# Altium footprint library THD Connectors-1.PcbLib: 129 footprints (part 2 of 9)
Each footprint in its own frame and in the unit in brackets; x right, y up, seen from the top. Pads: shape width x height; smd on the part's side, far side on the other; paste and mask are expansions set on the pad; w line width, h text height; cw(c..) or ccw(c..) is an arc to the next point about the centre after c.
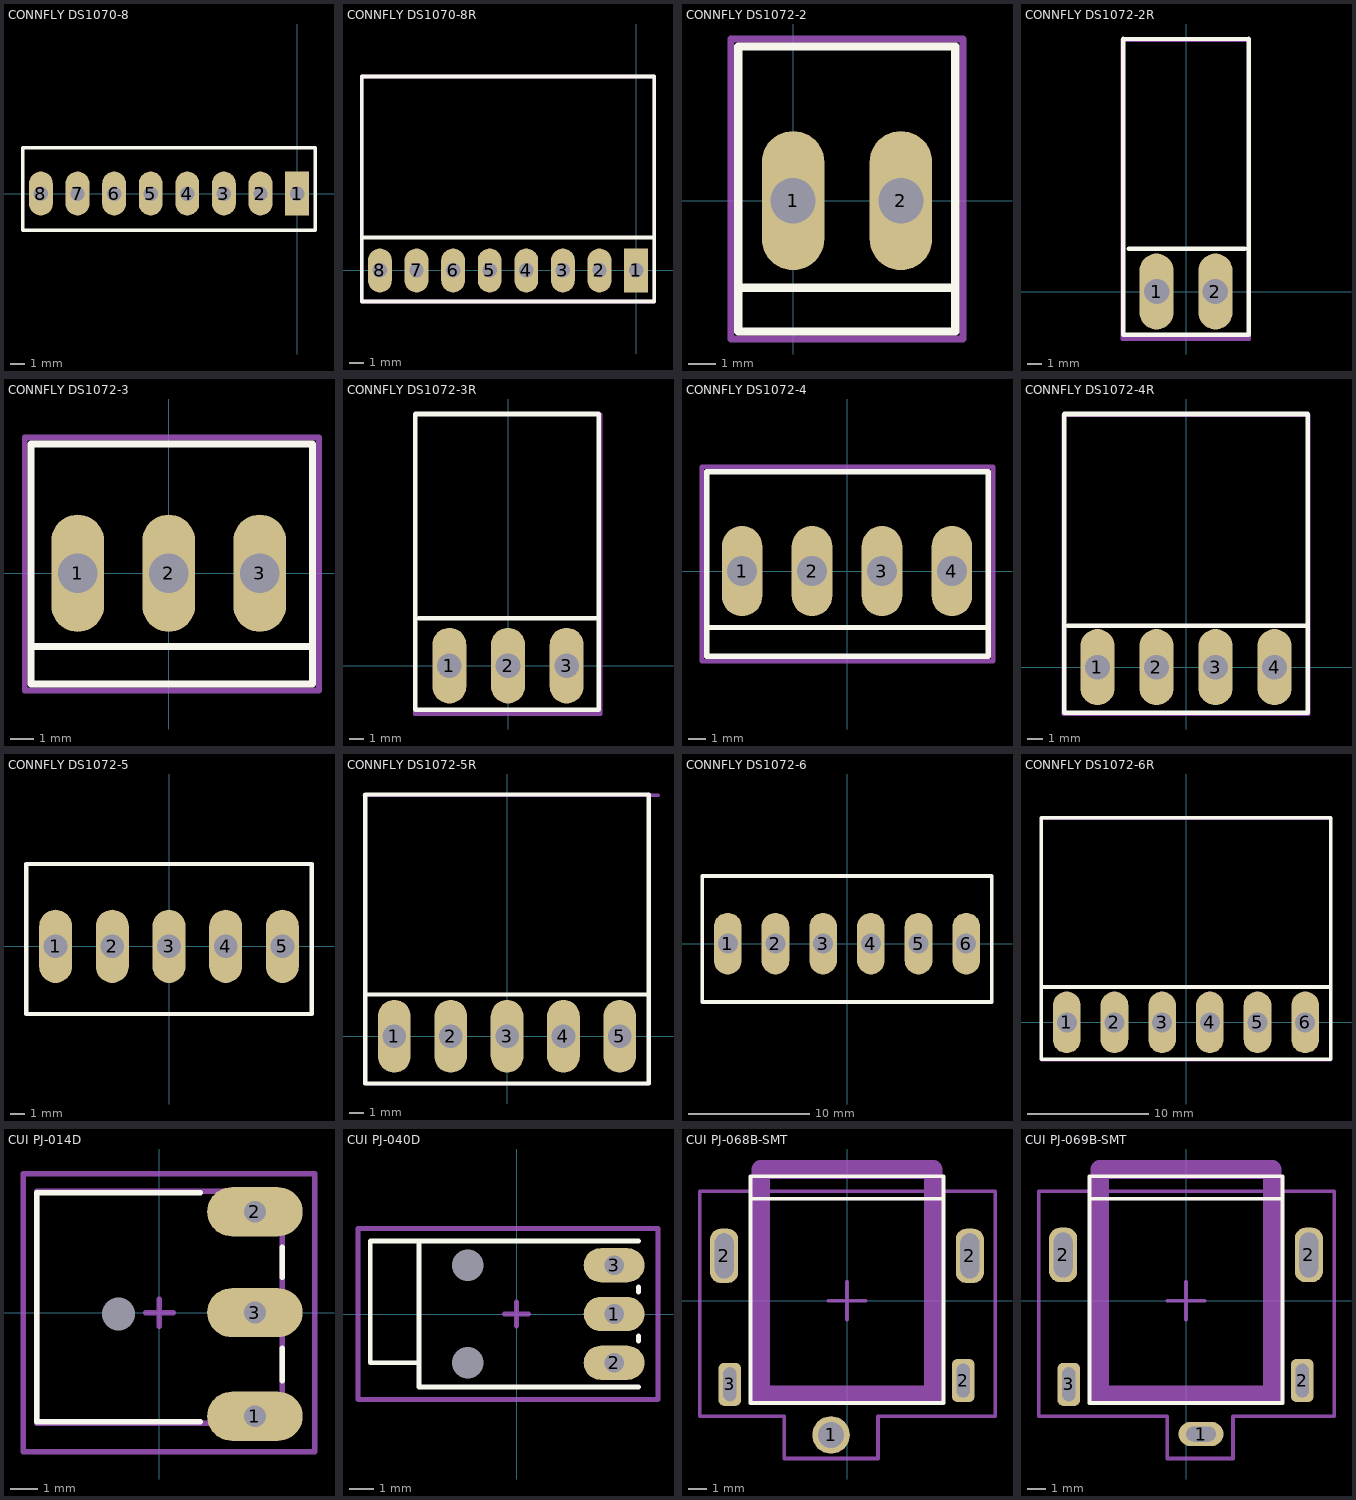
[diagram p1: the footprints below, top view; thin cyan lines are the x and y axes]

## CONNFLY DS1070-8 [mil]
pads (8):
  rect 65x120 hole 39.37: 1(0,0)
  oval 65x120 hole 39.37: 2(-100,0) 3(-200,0) 4(-300,0) 5(-400,0) 6(-500,0) 7(-600,0) 8(-700,0)
Top Overlay:
  lines w10: -750,-100 50,-100 50,125 -750,125 -750,-100
3D body "WF-8.STEP": height 448.15, standoff -134.53, extent -750,-98.35 50,130

## CONNFLY DS1070-8R [mil]
pads (8):
  rect 65x120 hole 39.37: 1(0,0)
  oval 65x120 hole 39.37: 2(-100,0) 3(-200,0) 4(-300,0) 5(-400,0) 6(-500,0) 7(-600,0) 8(-700,0)
Top Overlay:
  lines w10: -750,90 50,90 ; -750,-85 -750,530 50,530 50,-85 -750,-85
Mechanical 15:
  lines w10: -750,-85 -750,530 50,530 50,-85 -750,-85
3D body "WF-8R (BM).STEP": height 228.35, standoff -137.8, extent -750,-15 50,525.16

## CONNFLY DS1072-2 [mil] "connfly electronic CO,.LTD."
pads (2):
  oval 90x200 hole 65: 1(0,0) 2(155,0)
Top Overlay:
  lines w11.81: -78.74,221.46 233.27,221.46
  lines w12: -78.74,221.46 -78.74,-187.99 233.27,-187.99 233.27,221.46 ; -75,-125 230,-125
Mechanical 15:
  lines w9.84: -89.57,-198.82 244.09,-198.82 244.09,232.28 -89.57,232.28 -89.57,-198.82
3D body "PWL-2.STEP": height 545.28, standoff -139.76, extent -78.74,-188 233.07,221.45

## CONNFLY DS1072-2R [mil] "connfly electronic CO,.LTD."
pads (2):
  oval 90x200 hole 66.93: 1(-77.5,0) 2(77.5,0)
Top Overlay:
  lines w11.81: -165,665 165,665
  lines w12: -165,665 -165,-114.17 165,-114.17 165,665 ; -150.53,112.2 154.47,112.2
Mechanical 15:
  lines w9.84: -167.32,-125 166.34,-125 166.34,662.4 -167.32,662.4 -167.32,-125
3D body "PWL-2R.STEP": height 411.42, standoff -143.7, extent -155.91,-22.64 155.91,657.21

## CONNFLY DS1072-3 [mil] "connfly electronic CO,.LTD."
pads (3):
  oval 90x200 hole 66.93: 1(-155,0) 2(0,0) 3(155,0)
Top Overlay:
  lines w12: -230,-125 244.09,-125 ; -234.25,-188.98 -234.25,220.47 245.08,220.47 245.08,-188.98 -234.25,-188.98
Mechanical 15:
  lines w9.84: -245.08,-199.8 -245.08,231.3 255.91,231.3 255.91,-199.8 -245.08,-199.8
3D body "PWL-3.STEP": height 545.28, standoff -139.76, extent -228.54,-188.98 239.17,220.47

## CONNFLY DS1072-3R [mil] "connfly electronic CO,.LTD."
pads (3):
  oval 90x200 hole 65: 1(-155,0) 2(0,0) 3(155,0)
Top Overlay:
  lines w12: -235.24,125 234.25,125 ; -245,-117.13 -245,665 240,665 240,-117.13 -245,-117.13
Mechanical 15:
  lines w9.84: -246.06,-127.95 -246.06,664.37 245.08,664.37 245.08,-127.95 -246.06,-127.95
3D body "PWL-3R.STEP": height 411.42, standoff -143.7, extent -233.86,-19.06 233.86,660.79

## CONNFLY DS1072-4 [mil] "connfly electronic CO,.LTD."
pads (4):
  oval 90x200 hole 66.93: 1(-232.5,0) 2(-77.5,0) 3(77.5,0) 4(232.5,0)
Top Overlay:
  lines w12: -307.5,-125 307.5,-125 ; -311.24,-188.98 312.78,-188.98 312.78,220.47 -311.24,220.47 -311.24,-188.98
Mechanical 15:
  lines w9.84: -321.85,-199.8 323.82,-199.8 323.82,231.3 -321.85,231.3 -321.85,-199.8
3D body "PWL-4.STEP": height 545.28, standoff -139.76, extent -311.81,-187.99 311.81,221.46

## CONNFLY DS1072-4R [mil] "connfly electronic CO,.LTD."
pads (4):
  oval 90x200 hole 65: 1(-232.5,0) 2(-77.5,0) 3(77.5,0) 4(232.5,0)
Top Overlay:
  lines w12: -311.02,108.27 315,108.27 ; -320,-120 -320,665 320,665 320,-120 -320,-120
Mechanical 15:
  lines w9.84: -321.85,-123.03 321.85,-123.03 321.85,662.4 -321.85,662.4 -321.85,-123.03
3D body "PWL-4R.STEP": height 411.42, standoff -143.7, extent -311.81,-22.01 311.81,657.84

## CONNFLY DS1072-5 [mil] "connfly electronic CO,.LTD."
pads (5):
  oval 90x200 hole 65: 1(-310,0) 2(-155,0) 3(0,0) 4(155,0) 5(310,0)
Top Overlay:
  lines w12: -390,-185 -390,225 390,225 390,-185 -390,-185
Mechanical 15:
  lines w9.84: 390,-185 -390,-185 -390,225 390,225
  lines w10: 390,-185 390,225
3D body "PWL-5.STEP": height 545.28, standoff -139.76, extent -389.53,-189.44 390,220.01
3D body "PWL-5.STEP": height 543.31, standoff -141.73, extent -394.76,-185 384.76,224.45

## CONNFLY DS1072-5R [mil] "connfly electronic CO,.LTD."
pads (5):
  oval 90x200 hole 65: 1(-310,0) 2(-155,0) 3(0,0) 4(155,0) 5(310,0)
Top Overlay:
  lines w12: -390,115 390,115 ; -390,-130 390,-130 390,665 -390,665 -390,-130
Mechanical 15:
  lines w9.84: -392.5,662.4 415,662.4 ; -390,660 -390,-130 390,-130
  lines w10: 390,-130 390,665
3D body "PWL-5R.STEP": height 411.42, standoff -143.7, extent -389.31,-21.54 390.21,658.31

## CONNFLY DS1072-6 [mil] "connfly electronic CO,.LTD."
pads (6):
  oval 90x200 hole 65: 1(-387.5,0) 2(-232.5,0) 3(-77.5,0) 4(77.5,0) 5(232.5,0) 6(387.5,0)
Top Overlay:
  lines w12: -470,-190 -470,220 470,220 470,-190 -470,-190
Mechanical 15:
  lines w9.84: -470,-190 470,-190 470,220 -470,220 -470,-190
3D body "PWL-6.STEP": height 545.28, standoff -139.76, extent -467.72,-189.45 467.72,220

## CONNFLY DS1072-6R [mil] "connfly electronic CO,.LTD."
pads (6):
  oval 90x200 hole 65: 1(-387.5,0) 2(-232.5,0) 3(-77.5,0) 4(77.5,0) 5(232.5,0) 6(387.5,0)
Top Overlay:
  lines w12: -470,115 470,115 ; -470,-120 470,-120 470,665 -470,665 -470,-120
Mechanical 15:
  lines w9.84: -470,-123.03 -470,662.4 470,662.4 470,-123.03 -470,-123.03
3D body "PWL-6R.STEP": height 411.42, standoff -143.7, extent -466.81,-21.54 468.62,658.31

## CUI PJ-014D [mm]
height 5.5
pads (4):
  oval 3.5x1.8 hole 0.8 square: 1(3.5,-3.8) 2(3.5,3.7) 3(3.5,0)
  round 0 hole 1.2 unplated: M(-1.5,-0.05)
Top Overlay:
  lines w0.2: 1.5,-4 -4.5,-4 -4.5,4.4 1.5,4.4 ; 4.5,-2.5 4.5,-1.3 ; 4.5,1.3 4.5,2.4
Mechanical 1:
  lines w0.2: -4.5,-4.05 -4.5,4.45 4.5,4.45 4.5,-4.05 -4.5,-4.05
Mechanical 15:
  lines w0.2: -0.5,0 0.5,0 ; 0,-0.5 0,0.5 ; -5,-5.1 -5,5.1 5.7,5.1 5.7,-5.1 -5,-5.1
3D body "CUI PJ-014D.STEP": height 5.5, standoff -3.5, extent -4.5,-4.05 4.5,4.45

## CUI PJ-040D [mm]
height 5
pads (5):
  oval 2.5x1.4 hole 0.8 square: 1(4,0) 2(4,-2) 3(4,2)
  round 0 hole 1.3 unplated: M(-2,-2) M(-2,2)
Top Overlay:
  lines w0.2: -4,3 -4,-2 ; 5,-3 -4,-3 -4,-2 ; 5,-1.1 5,-0.9 ; 5,0.9 5,1.1 ; 5,3 -6,3 -6,-2 -4,-2
Mechanical 15:
  lines w0.2: -0.5,0 0.5,0 ; 0,-0.5 0,0.5 ; -6.5,-3.5 -6.5,3.5 5.8,3.5 5.8,-3.5 -6.5,-3.5
3D body "CUI pj-040d.STEP": height 5, standoff -3, extent -6,-3 5,3

## CUI PJ-068B-SMT [mm] "Mid Mount DC Power Jack"
height 5.45
pads (5):
  round 2 hole 1.4 unplated: 1(-0.85,-7.15)
  rrect75% 1.5x2.9 hole 1 slot 2.4 at 90 deg unplated: 2(-6.55,2.4) 2(6.55,2.4)
  rrect50% 1.2x2.3 hole 0.7 slot 1.8 at 90 deg unplated: 2(6.2,-4.25) 3(-6.25,-4.45)
Top Overlay:
  lines w0.2: -5.15,5.45 -0.85,5.45 5.15,5.45 ; -5.15,5.45 -5.15,-5.45 5.15,-5.45 5.15,5.45 ; -5.15,5.45 -5.15,6.65 5.15,6.65 5.15,5.45
Mechanical 15:
  lines w0.2: -1,0 1,0 ; 0,-1 0,1 ; -7.85,-6.15 -3.35,-6.15 -3.35,-8.4 -0.85,-8.4 1.65,-8.4 1.65,-6.15 7.9,-6.15 7.9,5.85 -7.85,5.85 -7.85,-6.15
Mechanical 31:
  lines w0.6: -4.8,-4.5 -4.8,-5.2 -4,-5.2 ; 4,-5.2 4.8,-5.2 4.8,-4.5
  lines w1: -4.6,-5 4.6,-5 4.6,7 -4.6,7 -4.6,-5
3D body "pj-068b-smt.STEP": height 5.45, standoff -3.65, extent -6.55,-7.7 6.55,6.6

## CUI PJ-069B-SMT [mm] "Mid Mount DC Power Jack"
height 2.45
pads (5):
  oval 2.4x1.3 hole 0.8 slot 1.6 at 0 deg unplated: 1(0.8,-7.1)
  rrect75% 1.5x2.9 hole 1 slot 2.4 at 90 deg unplated: 2(-6.55,2.45) 2(6.55,2.45)
  rrect50% 1.2x2.3 hole 0.7 slot 1.8 at 90 deg unplated: 2(6.2,-4.25) 3(-6.25,-4.45)
Top Overlay:
  lines w0.2: -5.15,5.45 -5.15,6.65 5.15,6.65 5.15,5.45 ; -5.15,5.45 -5.15,-5.45 5.15,-5.45 5.15,5.45 ; -5.15,5.45 -0.85,5.45 5.15,5.45
Mechanical 15:
  lines w0.2: -1,0 1,0 ; 0,-1 0,1 ; -7.85,-6.15 -7.85,5.85 7.9,5.85 7.9,-6.15 2.5,-6.15 2.5,-8.4 -0.85,-8.4 -1,-8.4 -1,-6.15 -7.85,-6.15
Mechanical 31:
  lines w0.6: -4.8,-4.5 -4.8,-5.2 -4,-5.2 ; 4,-5.2 4.8,-5.2 4.8,-4.5
  lines w1: -4.6,-5 -4.6,7 4.6,7 4.6,-5 -4.6,-5
3D body "PJ-069B-SMT.STEP": height 2.55, standoff -6.45, extent -6.55,-7.35 6.55,6.6